# Altium footprint library PcbLib_ICs_part2.PcbLib: 66 footprints (part 2 of 5)
Each footprint in its own frame and in the unit in brackets; x right, y up, seen from the top. Pads: shape width x height; smd on the part's side, far side on the other; paste and mask are expansions set on the pad; w line width, h text height; cw(c..) or ccw(c..) is an arc to the next point about the centre after c.
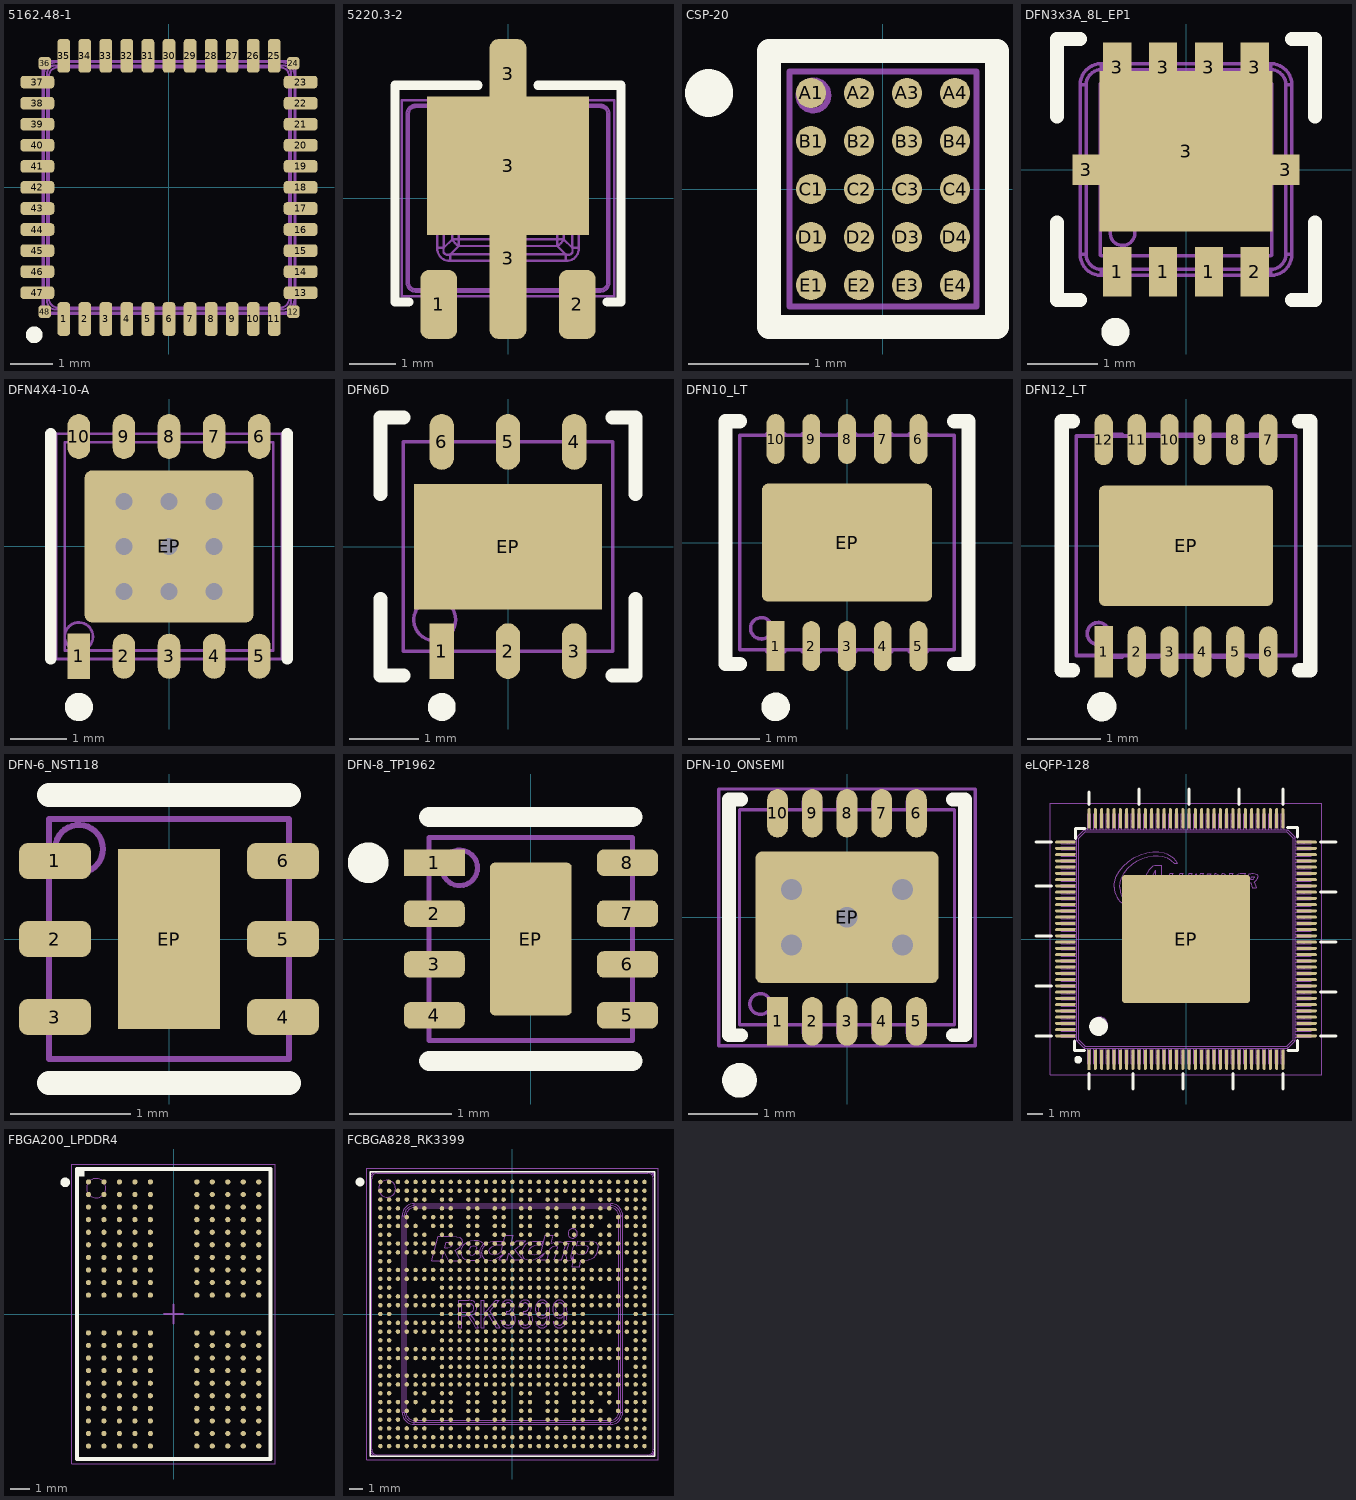
[diagram p1: the footprints below, top view; thin cyan lines are the x and y axes]

## 5162.48-1 [mm]
pads (48):
  rrect50% 0.3x0.8 smd paste+0 mask+0.07: 1(-2.5,-3.125) 2(-2,-3.125) 3(-1.5,-3.125) 4(-1,-3.125) 5(-0.5,-3.125) 6(0,-3.125) 7(0.5,-3.125) 8(1,-3.125) 9(1.5,-3.125) 10(2,-3.125) 11(2.5,-3.125) 25(2.5,3.125) 26(2,3.125) 27(1.5,3.125) 28(1,3.125) 29(0.5,3.125) 30(0,3.125) 31(-0.5,3.125) 32(-1,3.125) 33(-1.5,3.125) 34(-2,3.125) 35(-2.5,3.125)
  rrect50% 0.3x0.3 smd paste+0 mask+0.07: 12(2.95,-2.95) 24(2.95,2.95) 36(-2.95,2.95) 48(-2.95,-2.95)
  rrect50% 0.8x0.3 smd paste+0 mask+0.07: 13(3.125,-2.5) 14(3.125,-2) 15(3.125,-1.5) 16(3.125,-1) 17(3.125,-0.5) 18(3.125,0) 19(3.125,0.5) 20(3.125,1) 21(3.125,1.5) 22(3.125,2) 23(3.125,2.5) 37(-3.125,2.5) 38(-3.125,2) 39(-3.125,1.5) 40(-3.125,1) 41(-3.125,0.5) 42(-3.125,0) 43(-3.125,-0.5) 44(-3.125,-1) 45(-3.125,-1.5) 46(-3.125,-2) 47(-3.125,-2.5)
Top Overlay:
  circle w0.2: c-3.2,-3.5 r0.1
Top Assy:
  lines w0.05: -2.998,2.877 ccw(c-3.068,3.07) -2.875,3 ; -2.875,-3 ccw(c-3.068,-3.07) -2.998,-2.877 -2.998,-2.872 ; 2.879,-3 cw(c3.072,-3.07) 3.002,-2.877 ; 2.879,3 ccw(c3.072,3.07) 3.002,2.877 ; -2.998,-2.872 cw(c-3.068,-3.07) -2.87,-3 2.874,-3 cw(c3.072,-3.07) 3.002,-2.872 3.002,2.872 cw(c3.072,3.07) 2.874,3 -2.87,3 cw(c-3.068,3.07) -2.998,2.872 -2.998,-2.872 ; -2.973,-2.825 cw(c-2.973,-2.975) -2.823,-2.975 2.677,-2.975 ccw(c2.677,-2.675) 2.977,-2.675 2.977,2.675 ccw(c2.677,2.675) 2.677,2.975 -2.673,2.975 ccw(c-2.673,2.675) -2.973,2.675 -2.973,-2.825 ; -2.898,-2.7 ccw(c-2.698,-2.7) -2.698,-2.9 2.702,-2.9 ccw(c2.702,-2.7) 2.902,-2.7 2.902,2.7 ccw(c2.702,2.7) 2.702,2.9 -2.698,2.9 ccw(c-2.698,2.7) -2.898,2.7 -2.898,-2.7 ; -2.848,-2.65 ccw(c-2.648,-2.65) -2.648,-2.85 2.652,-2.85 ccw(c2.652,-2.65) 2.852,-2.65 2.852,2.65 ccw(c2.652,2.65) 2.652,2.85 -2.648,2.85 ccw(c-2.648,2.65) -2.848,2.65 -2.848,-2.65
  text ".Designator" at -3.443,-0.467 h2
3D body "5162.48-1 ??????.stp": height 1.61, standoff -0.01, extent -3,-3 3,3

## 5220.3-2 [mm]
pads (5):
  rrect50% 0.8x1.5 smd: 1(-1.5,-2.3) 2(1.5,-2.3)
  rrect50% 0.8x3.5 smd paste-10: 3(0,-1.3)
  rect 3.5x3 smd paste-10: 3(0,0.7)
  rrect50% 0.8x1.5 smd paste-10: 3(0,2.7)
Top Overlay:
  lines w0.2: -2.15,-2.25 -2.45,-2.25 -2.45,2.45 -0.65,2.45 ; 0.65,2.45 2.45,2.45 2.45,-2.25 2.15,-2.25
Top Paste:
  rectangle: -1.65,1.55 -1.1,2.1
  rectangle: -1,1.55 -0.45,2.1
  rectangle: -0.3,1.55 0.25,2.1
  rectangle: 0.4,1.55 0.95,2.1
  rectangle: 1.1,1.55 1.65,2.1
  rectangle: -0.25,2.8 0.25,3.3
  rectangle: -0.25,2.2 0.25,2.7
  rectangle: 1.1,0.9 1.65,1.45
  rectangle: 0.4,0.9 0.95,1.45
  rectangle: -0.3,0.9 0.25,1.45
  rectangle: -1,0.9 -0.45,1.45
  rectangle: -1.65,0.9 -1.1,1.45
  rectangle: 1.1,0.25 1.65,0.8
  rectangle: 0.4,0.25 0.95,0.8
  rectangle: -0.3,0.25 0.25,0.8
  rectangle: -1,0.25 -0.45,0.8
  rectangle: -1.65,0.25 -1.1,0.8
  rectangle: 1.1,-0.7 1.65,0.15
  rectangle: 0.4,-0.7 0.95,0.15
  rectangle: -0.3,-0.7 0.25,0.15
  rectangle: -1,-0.7 -0.45,0.15
  rectangle: -1.65,-0.7 -1.1,0.15
  rectangle: -0.25,-1.9 0.25,-1.4
  rectangle: -0.25,-1.3 0.25,-0.8
  rectangle: -0.25,-2.95 0.25,-2.6
  rectangle: -0.25,-2.5 0.25,-2
Top Assy:
  lines w0.05: -1.74,-2.125 -1.74,-2.625 -1.26,-2.625 -1.26,-2.125 ; -1.209,-0.892 ccw(c-0.917,-0.742) -1.067,-1.034 ; -0.225,-2.125 -0.225,-2.625 0.225,-2.625 0.225,-2.125 ; -0.225,2.125 -0.225,2.625 0.225,2.625 0.225,2.125 ; 1.26,-2.125 1.26,-2.625 1.74,-2.625 1.74,-2.125 ; -2.2,-1.825 ccw(c-2,-1.825) -2,-2.025 ; -2.2,-1.825 -2.15,-1.825 ; -2.2,-1.825 -2.2,1.825 ; -2.2,1.825 cw(c-2,1.825) -2,2.025 ; -2.2,1.825 -2.15,1.825 ; -2.15,-1.825 ccw(c-2.001,-1.826) -2,-1.975 ; -2.15,-1.825 -2.15,1.825 ; -2.15,1.825 cw(c-2.001,1.826) -2,1.975 ; -2,-2.025 -2,-1.975 ; -2,-2.025 2,-2.025 ; -2,-1.975 2,-1.975 ; -2,1.975 -2,2.025 ; -2,1.975 2,1.975 ; -2,2.025 2,2.025 ; -1.533,-1.075 ccw(c-1.269,-1.094) -1.25,-1.358 ; -1.533,-1.075 -1.391,-1.075 ; -1.533,-1.075 -1.533,1.075 ; -1.533,1.075 cw(c-1.269,1.094) -1.25,1.358 ; -1.533,1.075 -1.391,1.075 ; -1.391,-1.075 -1.391,1.075 ; -1.391,-1.075 -1.209,-0.892 ; -1.391,-1.075 -1.398,-1.116 -1.398,-1.151 -1.39,-1.179 -1.375,-1.2 -1.354,-1.215 -1.326,-1.223 -1.291,-1.223 -1.25,-1.216 ; -1.391,1.075 -1.398,1.116 -1.398,1.151 -1.39,1.179 -1.375,1.2 -1.354,1.215 -1.326,1.223 -1.291,1.223 -1.25,1.216 ; -1.391,1.075 -1.209,0.892 ; -1.25,-1.358 -1.25,-1.216 ; -1.25,-1.358 1.25,-1.358 ; -1.25,-1.216 1.25,-1.216 ; -1.25,-1.216 -1.067,-1.034 ; -1.25,1.216 -1.25,1.358 ; -1.25,1.216 1.25,1.216 ; -1.25,1.216 -1.067,1.034 ; -1.25,1.358 1.25,1.358 ; -1.209,-0.892 -1.209,0.892 ; -1.209,-0.892 -1.067,-0.892 ; -1.209,0.892 cw(c-0.917,0.742) -1.067,1.034 ; -1.209,0.892 -1.194,0.892 -1.178,0.892 -1.161,0.892 -1.144,0.892 -1.125,0.892 -1.106,0.892 -1.087,0.892 -1.067,0.892 ; -1.067,-1.034 1.067,-1.034 ; -1.067,-1.034 -1.067,-1.019 -1.067,-1.003 -1.067,-0.986 -1.067,-0.969 -1.067,-0.95 -1.067,-0.931 -1.067,-0.912 -1.067,-0.892 ; -1.067,-0.892 -1.067,0.892 ; -1.067,-0.892 1.067,-0.892 ; -1.067,0.892 -1.067,1.034 ; -1.067,0.892 1.067,0.892 ; -1.067,1.034 1.067,1.034 ; 1.067,-1.034 ccw(c0.917,-0.742) 1.209,-0.892 1.194,-0.892 1.178,-0.892 1.161,-0.892 1.144,-0.892 1.125,-0.892 1.106,-0.892 1.087,-0.892 1.067,-0.892 ; 1.067,-1.034 1.067,-0.892 ; 1.067,-1.034 1.25,-1.216 ; 1.067,-0.892 1.067,0.892 ; 1.067,0.892 1.067,0.912 1.067,0.931 1.067,0.95 1.067,0.969 1.067,0.986 1.067,1.003 1.067,1.019 1.067,1.034 ; 1.067,0.892 1.209,0.892 ; 1.067,1.034 cw(c0.917,0.742) 1.209,0.892 ; 1.067,1.034 1.25,1.216 ; 1.209,0.892 1.209,-0.892 1.391,-1.075 ; 1.209,0.892 1.391,1.075 ; 1.25,-1.358 ccw(c1.269,-1.094) 1.533,-1.075 ; 1.25,-1.358 1.25,-1.216 ; 1.25,-1.216 1.291,-1.223 1.326,-1.223 1.354,-1.215 1.375,-1.2 1.39,-1.179 1.398,-1.151 1.398,-1.116 1.391,-1.075 ; 1.25,1.216 1.25,1.358 ; 1.25,1.216 1.291,1.223 1.326,1.223 1.354,1.215 1.375,1.2 1.39,1.179 1.398,1.151 1.398,1.116 1.391,1.075 ; 1.25,1.358 cw(c1.269,1.094) 1.533,1.075 ; 1.391,-1.075 1.533,-1.075 ; 1.391,-1.075 1.391,1.075 ; 1.391,1.075 1.533,1.075 ; 1.533,-1.075 1.533,1.075 ; 2,-2.025 ccw(c2,-1.825) 2.2,-1.825 ; 2,-2.025 2,-1.975 ; 2,-1.975 ccw(c2.001,-1.826) 2.15,-1.825 ; 2,1.975 cw(c2.001,1.826) 2.15,1.825 ; 2,1.975 2,2.025 ; 2,2.025 cw(c2,1.825) 2.2,1.825 ; 2.15,-1.825 2.2,-1.825 ; 2.15,-1.825 2.15,1.825 ; 2.15,1.825 2.2,1.825 ; 2.2,-1.825 2.2,1.825 ; -2.3,-2.125 2.3,-2.125 2.3,2.125 -2.3,2.125 -2.3,-2.125
  text ".Designator" at -2.579,-0.349 h1.5
3D body "5220_3-2.STEP": height 1.61, standoff 0, extent -2.3,-2.625 2.3,2.625

## CSP-20 [mil] "20-ball package, 1.56x1.96mm"
pads (20):
  round 10 smd mask+1.97: A1(-23.62,31.5) A2(-7.87,31.5) A3(7.87,31.5) A4(23.62,31.5) B1(-23.62,15.75) B2(-7.87,15.75) B3(7.87,15.75) B4(23.62,15.75) C1(-23.62,0) C2(-7.87,0) C3(7.87,0) C4(23.62,0) D1(-23.62,-15.75) D2(-7.87,-15.75) D3(7.87,-15.75) D4(23.62,-15.75) E1(-23.62,-31.5) E2(-7.87,-31.5) E3(7.87,-31.5) E4(23.62,-31.5)
Top Overlay:
  circle w7.87: c-57.09,31.5 r3.94
  lines w7.87: -37.4,-45.28 -37.4,45.28 37.4,45.28 37.4,-45.28 -37.4,-45.28
Top Assy:
  circle w1.97: c-22.83,30.71 r4.92
  lines w1.97: -30.71,-38.58 -30.71,38.58 30.71,38.58 30.71,-38.58 -30.71,-38.58
  text ".Designator" at 9.17,-67.69 h39.37
3D body "CSP1.56_1.96_20.x_t": height 24.02, standoff -1.06, extent -30.71,-38.58 30.71,38.58

## DFN3x3A_8L_EP1 [mm] "Power 3mm x 3mm"
pads (11):
  rect 0.4x0.7 smd paste-0.05 mask+0.05: 1(-0.975,-1.45) 1(-0.325,-1.45) 1(0.325,-1.45) 2(0.975,-1.45) 3(-0.975,1.45) 3(-0.325,1.45) 3(0.325,1.45) 3(0.975,1.45)
  rect 0.4x0.43 smd paste-0.05 mask+0.05: 3(-1.41,0) 3(1.41,0)
  rect 2.45x2.28 smd paste-5 mask+0.05: 3(0,0.26)
Top Overlay:
  circle w0.2: c-1,-2.3 r0.1
  lines w0.2: -1.825,-0.75 -1.825,-1.85 -1.5,-1.85 ; -1.825,0.75 -1.825,1.85 -1.5,1.85 ; 1.5,-1.85 1.825,-1.85 1.825,-0.75 ; 1.5,1.85 1.825,1.85 1.825,0.75
Top Paste:
  rectangle: 0.55,-0.85 1.05,-0.35
  rectangle: -0.25,-0.85 0.25,-0.35
  rectangle: -1.05,-0.85 -0.55,-0.35
  rectangle: 0.55,-0.15 1.05,0.35
  rectangle: -0.25,-0.15 0.25,0.35
  rectangle: -1.05,-0.15 -0.55,0.35
  region: 1.05,1.05 0.55,1.05 0.55,0.55 1.05,0.55
  region: 0.25,1.05 -0.25,1.05 -0.25,0.55 0.25,0.55
  region: -0.55,1.05 -1.05,1.05 -1.05,0.55 -0.55,0.55
Top Assy:
  circle w0.05: c-0.9,-0.9 r0.175
  lines w0.05: -1.5,-1.2 ccw(c-1.2,-1.2) -1.2,-1.5 ; -1.5,-1.2 -1.415,-1.2 ; -1.5,-1.2 -1.5,-0.063 ; -1.5,-0.063 -1.55,-0.063 -1.55,0.062 -1.5,0.062 ; -1.5,-0.063 -1.5,0.062 ; -1.5,0.062 -1.5,1.2 ; -1.5,1.2 cw(c-1.2,1.2) -1.2,1.5 ; -1.5,1.2 -1.415,1.2 ; -1.415,-1.2 ccw(c-1.2,-1.2) -1.2,-1.415 ; -1.415,-1.2 -1.415,1.2 ; -1.415,1.2 cw(c-1.2,1.2) -1.2,1.415 ; -1.2,-1.5 -1.2,-1.415 ; -1.2,-1.5 -1.125,-1.5 ; -1.2,-1.415 1.2,-1.415 ; -1.2,1.415 -1.2,1.5 ; -1.2,1.415 1.2,1.415 ; -1.2,1.5 -1.125,1.5 ; -1.125,-1.5 -1.125,-1.6 -0.825,-1.6 -0.825,-1.5 ; -1.125,-1.5 -0.825,-1.5 ; -1.125,1.5 -1.125,1.6 -0.825,1.6 -0.825,1.5 ; -1.125,1.5 -0.825,1.5 ; -0.825,-1.5 -0.475,-1.5 ; -0.825,1.5 -0.475,1.5 ; -0.475,-1.5 -0.475,-1.6 -0.175,-1.6 -0.175,-1.5 ; -0.475,-1.5 -0.175,-1.5 ; -0.475,1.5 -0.475,1.6 -0.175,1.6 -0.175,1.5 ; -0.475,1.5 -0.175,1.5 ; -0.175,-1.5 0.175,-1.5 ; -0.175,1.5 0.175,1.5 ; 0.175,-1.5 0.175,-1.6 0.475,-1.6 0.475,-1.5 ; 0.175,-1.5 0.475,-1.5 ; 0.175,1.5 0.175,1.6 0.475,1.6 0.475,1.5 ; 0.175,1.5 0.475,1.5 ; 0.475,-1.5 0.825,-1.5 ; 0.475,1.5 0.825,1.5 ; 0.825,-1.5 0.825,-1.6 1.125,-1.6 1.125,-1.5 ; 0.825,-1.5 1.125,-1.5 ; 0.825,1.5 0.825,1.6 1.125,1.6 1.125,1.5 ; 0.825,1.5 1.125,1.5 ; 1.125,-1.5 1.2,-1.5 ; 1.125,1.5 1.2,1.5 ; 1.2,-1.5 ccw(c1.2,-1.2) 1.5,-1.2 ; 1.2,-1.5 1.2,-1.415 ; 1.2,-1.415 ccw(c1.2,-1.2) 1.415,-1.2 ; 1.2,1.415 cw(c1.2,1.2) 1.415,1.2 ; 1.2,1.415 1.2,1.5 ; 1.2,1.5 cw(c1.2,1.2) 1.5,1.2 ; 1.415,-1.2 1.5,-1.2 ; 1.415,-1.2 1.415,1.2 ; 1.415,1.2 1.5,1.2 ; 1.5,-1.2 1.5,-0.063 ; 1.5,-0.063 1.55,-0.063 1.55,0.062 1.5,0.062 ; 1.5,-0.063 1.5,0.062 ; 1.5,0.062 1.5,1.2 ; -1.218,-1.2 ccw(c-1.2,-1.2) -1.2,-1.218 1.2,-1.218 ccw(c1.2,-1.2) 1.218,-1.2 1.218,1.2 ccw(c1.2,1.2) 1.2,1.218 -1.2,1.218 ccw(c-1.2,1.2) -1.218,1.2 -1.218,-1.2
  text ".Designator" at -3.098,-0.42 h1.8
3D body "DFN3x3A_8L_EP1_P.STEP": height 0.83, standoff 0, extent -1.55,-1.6 1.55,1.6

## DFN4X4-10-A [mm] "DFN-10 package with 0.8mm pitch"
height 1
pads (11):
  rect 0.4x0.8 smd paste+0 mask+0.05: 1(-1.6,-1.95)
  oval 0.4x0.8 smd paste+0 mask+0.05: 2(-0.8,-1.95) 3(0,-1.95) 4(0.8,-1.95) 5(1.6,-1.95) 6(1.6,1.95) 7(0.8,1.95) 8(0,1.95) 9(-0.8,1.95) 10(-1.6,1.95)
  rrect10% 3x2.7 smd paste-10 mask+0.05: EP(0,0)
via 0,0 diameter 0.7 hole 0.3
via 0.8,0 diameter 0.7 hole 0.3
via 0.8,0.8 diameter 0.7 hole 0.3
via 0,0.8 diameter 0.7 hole 0.3
via -0.8,0.8 diameter 0.7 hole 0.3
via -0.8,0 diameter 0.7 hole 0.3
via -0.8,-0.8 diameter 0.7 hole 0.3
via 0,-0.8 diameter 0.7 hole 0.3
via 0.8,-0.8 diameter 0.7 hole 0.3
Top Overlay:
  circle w0.25: c-1.6,-2.85 r0.125
  lines w0.2: -2.1,-2 -2.1,2 ; 2.1,-2 2.1,2
Top Paste:
  region: 0.5,0.7 0.5,0.1 1.1,0.1 1.1,0.7
  region: 0.5,-0.1 0.5,-0.7 1.1,-0.7 1.1,-0.1
  region: -0.5,-0.7 -0.5,-0.1 -1.1,-0.1 -1.1,-0.7
  region: -0.5,0.1 -0.5,0.7 -1.1,0.7 -1.1,0.1
  region: 0.3,-0.7 0.3,-0.1 -0.3,-0.1 -0.3,-0.7
  region: 0.3,0.1 0.3,0.7 -0.3,0.7 -0.3,0.1
Bottom Solder:
  region: -1.6,-1.5 -1.6,-0.2 -1.4,0 -1.6,0.2 -1.6,1.5 -0.2,1.5 0,1.3 0.2,1.5 1.6,1.5 1.6,0.2 1.4,0 1.6,-0.2 1.6,-1.5 0.2,-1.5 0,-1.3 -0.2,-1.5
Top Assy:
  circle w0.05: c-1.6,-1.6 r0.25
  lines w0.05: -1.775,-2 -1.775,-2.025 -1.425,-2.025 -1.425,-2 ; -1.775,2 -1.775,2.025 -1.425,2.025 -1.425,2 ; -0.975,-2 -0.975,-2.025 -0.625,-2.025 -0.625,-2 ; -0.975,2 -0.975,2.025 -0.625,2.025 -0.625,2 ; -0.175,-2 -0.175,-2.025 0.175,-2.025 0.175,-2 ; -0.175,2 -0.175,2.025 0.175,2.025 0.175,2 ; 0.625,-2 0.625,-2.025 0.975,-2.025 0.975,-2 ; 0.625,2 0.625,2.025 0.975,2.025 0.975,2 ; 1.425,-2 1.425,-2.025 1.775,-2.025 1.775,-2 ; 1.425,2 1.425,2.025 1.775,2.025 1.775,2 ; -2,-2 -2,2 2,2 2,-2 -2,-2
  text ".Designator" at -3.443,-0.467 h2
Top Text:
  lines w0.05: -1.85,-1.85 -1.85,1.85 1.85,1.85 1.85,-1.85 -1.85,-1.85
  lines w0.1: -0.5,0 0.5,0 ; 0,-0.5 0,0.5
3D body "DFN4X4-10-A.x_t": height 0.8, standoff 0, extent -2,-2.025 2,2.025

## DFN6D [mm] "QFN 3mm x 3mm"
pads (7):
  rect 0.35x0.8 smd paste-0.05 mask+0.05: 1(-0.95,-1.5)
  oval 0.35x0.8 smd paste-0.05 mask+0.05: 2(0,-1.5) 3(0.95,-1.5) 4(0.95,1.5) 5(0,1.5) 6(-0.95,1.5)
  rect 2.7x1.8 smd paste-2 mask+0.05: EP(0,0)
Top Overlay:
  circle w0.2: c-0.95,-2.3 r0.1
  lines w0.2: -1.825,-0.75 -1.825,-1.85 -1.5,-1.85 ; -1.825,0.75 -1.825,1.85 -1.5,1.85 ; 1.5,-1.85 1.825,-1.85 1.825,-0.75 ; 1.5,1.85 1.825,1.85 1.825,0.75
Top Paste:
  rectangle: -0.3,-0.8 0.3,-0.2
  rectangle: -0.3,0.2 0.3,0.8
  rectangle: 0.6,-0.8 1.2,-0.2
  rectangle: 0.6,0.2 1.2,0.8
  region: -0.6,-0.2 -1.2,-0.2 -1.2,-0.8 -0.6,-0.8
  region: -0.6,0.8 -1.2,0.8 -1.2,0.2 -0.6,0.2
Top Assy:
  circle w0.05: c-1.05,-1.05 r0.3
  lines w0.05: -1.1,-1.5 -1.1,-1.525 -0.8,-1.525 -0.8,-1.5 ; -1.1,1.5 -1.1,1.525 -0.8,1.525 -0.8,1.5 ; -0.15,-1.5 -0.15,-1.525 0.15,-1.525 0.15,-1.5 ; -0.15,1.5 -0.15,1.525 0.15,1.525 0.15,1.5 ; 0.8,-1.5 0.8,-1.525 1.1,-1.525 1.1,-1.5 ; 0.8,1.5 0.8,1.525 1.1,1.525 1.1,1.5 ; -1.5,-1.5 1.5,-1.5 1.5,1.5 -1.5,1.5 -1.5,-1.5
  text ".Designator" at -2.579,-0.349 h1.5
3D body "DFN6D.STEP": height 1, standoff 0, extent -1.5,-1.525 1.5,1.525

## DFN10_LT [mm] "Power DFN 3mm x 3mm, 0.5mm pitch"
pads (11):
  rect 0.25x0.7 smd paste-0.025 mask+0.05: 1(-1,-1.45)
  oval 0.25x0.7 smd paste-0.025 mask+0.05: 2(-0.5,-1.45) 3(0,-1.45) 4(0.5,-1.45) 5(1,-1.45) 6(1,1.45) 7(0.5,1.45) 8(0,1.45) 9(-0.5,1.45) 10(-1,1.45)
  rrect10% 2.38x1.65 smd paste-3 mask+0.05: EP(0,0)
Top Overlay:
  circle w0.2: c-1,-2.3 r0.1
  lines w0.2: -1.5,-1.7 -1.7,-1.7 -1.7,1.7 -1.5,1.7 ; 1.5,-1.7 1.7,-1.7 1.7,1.7 1.5,1.7
Top Paste:
  region: -0.3,-0.1 -0.3,-0.7 0.3,-0.7 0.3,-0.1
  region: -0.3,0.7 -0.3,0.1 0.3,0.1 0.3,0.7
  region: -1.1,-0.1 -1.1,-0.7 -0.5,-0.7 -0.5,-0.1
  region: -1.1,0.7 -1.1,0.1 -0.5,0.1 -0.5,0.7
  region: 0.5,-0.1 0.5,-0.7 1.1,-0.7 1.1,-0.1
  region: 0.5,0.7 0.5,0.1 1.1,0.1 1.1,0.7
Top Assy:
  circle w0.05: c-1.2,-1.2 r0.15
  lines w0.05: -1.125,-1.5 -1.125,-1.525 -0.875,-1.525 -0.875,-1.5 ; -1.125,1.5 -1.125,1.525 -0.875,1.525 -0.875,1.5 ; -0.625,-1.5 -0.625,-1.525 -0.375,-1.525 -0.375,-1.5 ; -0.625,1.5 -0.625,1.525 -0.375,1.525 -0.375,1.5 ; -0.125,-1.5 -0.125,-1.525 0.125,-1.525 0.125,-1.5 ; -0.125,1.5 -0.125,1.525 0.125,1.525 0.125,1.5 ; 0.375,-1.5 0.375,-1.525 0.625,-1.525 0.625,-1.5 ; 0.375,1.5 0.375,1.525 0.625,1.525 0.625,1.5 ; 0.875,-1.5 0.875,-1.525 1.125,-1.525 1.125,-1.5 ; 0.875,1.5 0.875,1.525 1.125,1.525 1.125,1.5 ; -1.5,-1.5 -1.5,1.5 1.5,1.5 1.5,-1.5 -1.5,-1.5
  text ".Designator" at -3.443,-0.467 h2
3D body "DFN-10_LT.x_t": height 0.75, standoff 0, extent -1.5,-1.525 1.5,1.525

## DFN12_LT [mm] "Power DFN 3mm x 3mm, 0.45mm pitch"
pads (13):
  rect 0.25x0.7 smd paste-0.025 mask+0.05: 1(-1.125,-1.45)
  oval 0.25x0.7 smd paste-0.025 mask+0.05: 2(-0.675,-1.45) 3(-0.225,-1.45) 4(0.225,-1.45) 5(0.675,-1.45) 6(1.125,-1.45) 7(1.125,1.45) 8(0.675,1.45) 9(0.225,1.45) 10(-0.225,1.45) 11(-0.675,1.45) 12(-1.125,1.45)
  rrect10% 2.38x1.65 smd paste-3 mask+0.05: EP(0,0)
Top Overlay:
  circle w0.2: c-1.15,-2.2 r0.1
  lines w0.2: -1.55,-1.7 -1.7,-1.7 -1.7,1.7 -1.55,1.7 ; 1.55,-1.7 1.7,-1.7 1.7,1.7 1.55,1.7
Top Paste:
  region: 0.5,0.7 0.5,0.1 1.1,0.1 1.1,0.7
  region: 0.5,-0.1 0.5,-0.7 1.1,-0.7 1.1,-0.1
  region: -1.1,0.7 -1.1,0.1 -0.5,0.1 -0.5,0.7
  region: -1.1,-0.1 -1.1,-0.7 -0.5,-0.7 -0.5,-0.1
  region: -0.3,0.7 -0.3,0.1 0.3,0.1 0.3,0.7
  region: -0.3,-0.1 -0.3,-0.7 0.3,-0.7 0.3,-0.1
Top Assy:
  circle w0.05: c-1.2,-1.2 r0.15
  lines w0.05: -1.125,-1.5 -1.125,-1.525 -0.875,-1.525 -0.875,-1.5 ; -1.125,1.5 -1.125,1.525 -0.875,1.525 -0.875,1.5 ; -0.625,-1.5 -0.625,-1.525 -0.375,-1.525 -0.375,-1.5 ; -0.625,1.5 -0.625,1.525 -0.375,1.525 -0.375,1.5 ; -0.125,-1.5 -0.125,-1.525 0.125,-1.525 0.125,-1.5 ; -0.125,1.5 -0.125,1.525 0.125,1.525 0.125,1.5 ; 0.375,-1.5 0.375,-1.525 0.625,-1.525 0.625,-1.5 ; 0.375,1.5 0.375,1.525 0.625,1.525 0.625,1.5 ; 0.875,-1.5 0.875,-1.525 1.125,-1.525 1.125,-1.5 ; 0.875,1.5 0.875,1.525 1.125,1.525 1.125,1.5 ; -1.5,-1.5 1.5,-1.5 1.5,1.5 -1.5,1.5 -1.5,-1.5
  text ".Designator" at -3.443,-0.467 h2
3D body "DFN-12_LT.x_t": height 0.75, standoff 0, extent -1.5,-1.525 1.5,1.525

## DFN-6_NST118 [mm] "DFN 2mm x 2mm"
pads (7):
  rrect50% 0.6x0.3 smd paste-0.025 mask+0.05: 1(-0.95,0.65) 2(-0.95,0) 3(-0.95,-0.65) 4(0.95,-0.65) 5(0.95,0) 6(0.95,0.65)
  rect 0.85x1.5 smd paste-3 mask+0.05: EP(0,0)
Top Overlay:
  lines w0.2: -1,-1.2 1,-1.2 ; -1,1.2 1,1.2
Top Paste:
  rectangle: -0.3,-0.7 0.3,-0.1
  rectangle: -0.3,0.1 0.3,0.7
Top Assy:
  circle w0.05: c-0.75,0.75 r0.2
  lines w0.05: -1,-0.775 -1.025,-0.775 -1.025,-0.748 ; -1,-0.748 -1.025,-0.748 ; -1,-0.552 -1.025,-0.552 ; -1,-0.525 -1.025,-0.525 -1.025,-0.552 ; -1,-0.125 -1.025,-0.125 -1.025,-0.098 ; -1,-0.098 -1.025,-0.098 ; -1,0.098 -1.025,0.098 ; -1,0.125 -1.025,0.125 -1.025,0.098 ; -1,0.525 -1.025,0.525 -1.025,0.552 ; -1,0.552 -1.025,0.552 ; -1,0.748 -1.025,0.748 ; -1,0.775 -1.025,0.775 -1.025,0.748 ; 1,-0.775 1.025,-0.775 1.025,-0.748 ; 1,-0.748 1.025,-0.748 ; 1,-0.552 1.025,-0.552 ; 1,-0.525 1.025,-0.525 1.025,-0.552 ; 1,-0.125 1.025,-0.125 1.025,-0.098 ; 1,-0.098 1.025,-0.098 ; 1,0.098 1.025,0.098 ; 1,0.125 1.025,0.125 1.025,0.098 ; 1,0.525 1.025,0.525 1.025,0.552 ; 1,0.552 1.025,0.552 ; 1,0.748 1.025,0.748 ; 1,0.775 1.025,0.775 1.025,0.748 ; -1.025,-0.748 -1.025,-0.552 ; -1.025,-0.098 -1.025,0.098 ; -1.025,0.552 -1.025,0.748 ; 1.025,-0.748 1.025,-0.552 ; 1.025,-0.098 1.025,0.098 ; 1.025,0.552 1.025,0.748 ; -1,-1 1,-1 1,1 -1,1 -1,-1
  text ".Designator" at -2.064,-0.28 h1.2
3D body "DFN-6_NST118.x_t": height 0.8, standoff 0, extent -1.025,-1 1.025,1

## DFN-8_TP1962 [mm] "DFN 2mm x 2mm, 0.5mm pitch"
pads (9):
  rect 0.6x0.26 smd paste-0.025 mask+0.05: 1(-0.95,0.75)
  rrect50% 0.6x0.26 smd paste-0.025 mask+0.05: 2(-0.95,0.25) 3(-0.95,-0.25) 4(-0.95,-0.75) 5(0.95,-0.75) 6(0.95,-0.25) 7(0.95,0.25) 8(0.95,0.75)
  rrect10% 0.8x1.5 smd paste-3 mask+0.05: EP(0,0)
Top Overlay:
  circle w0.2: c-1.6,0.75 r0.1
  lines w0.2: -1,-1.2 1,-1.2 ; -1,1.2 1,1.2
Top Paste:
  region: 0.3,-0.1 -0.3,-0.1 -0.3,-0.7 0.3,-0.7
  region: 0.3,0.7 -0.3,0.7 -0.3,0.1 0.3,0.1
Top Assy:
  circle w0.05: c-0.7,0.7 r0.175
  lines w0.05: -1,-0.84 -1.025,-0.84 -1.025,-0.66 -1,-0.66 ; -1,-0.34 -1.025,-0.34 -1.025,-0.16 -1,-0.16 ; -1,0.16 -1.025,0.16 -1.025,0.34 -1,0.34 ; -1,0.66 -1.025,0.66 -1.025,0.84 -1,0.84 ; 1,-0.84 1.025,-0.84 1.025,-0.66 1,-0.66 ; 1,-0.34 1.025,-0.34 1.025,-0.16 1,-0.16 ; 1,0.16 1.025,0.16 1.025,0.34 1,0.34 ; 1,0.66 1.025,0.66 1.025,0.84 1,0.84 ; -1,-1 -1,1 1,1 1,-1 -1,-1
  text ".Designator" at -2.064,-0.28 h1.2
3D body "DFN-8_TP1962.x_t": height 0.8, standoff 0, extent -1.025,-1 1.025,1
